# Altium footprint library UAARG Autopilot.PcbLib: 95 footprints (part 6 of 6)
Each footprint in its own frame and in the unit in brackets; x right, y up, seen from the top. Pads: shape width x height; smd on the part's side, far side on the other; paste and mask are expansions set on the pad; w line width, h text height; cw(c..) or ccw(c..) is an arc to the next point about the centre after c.
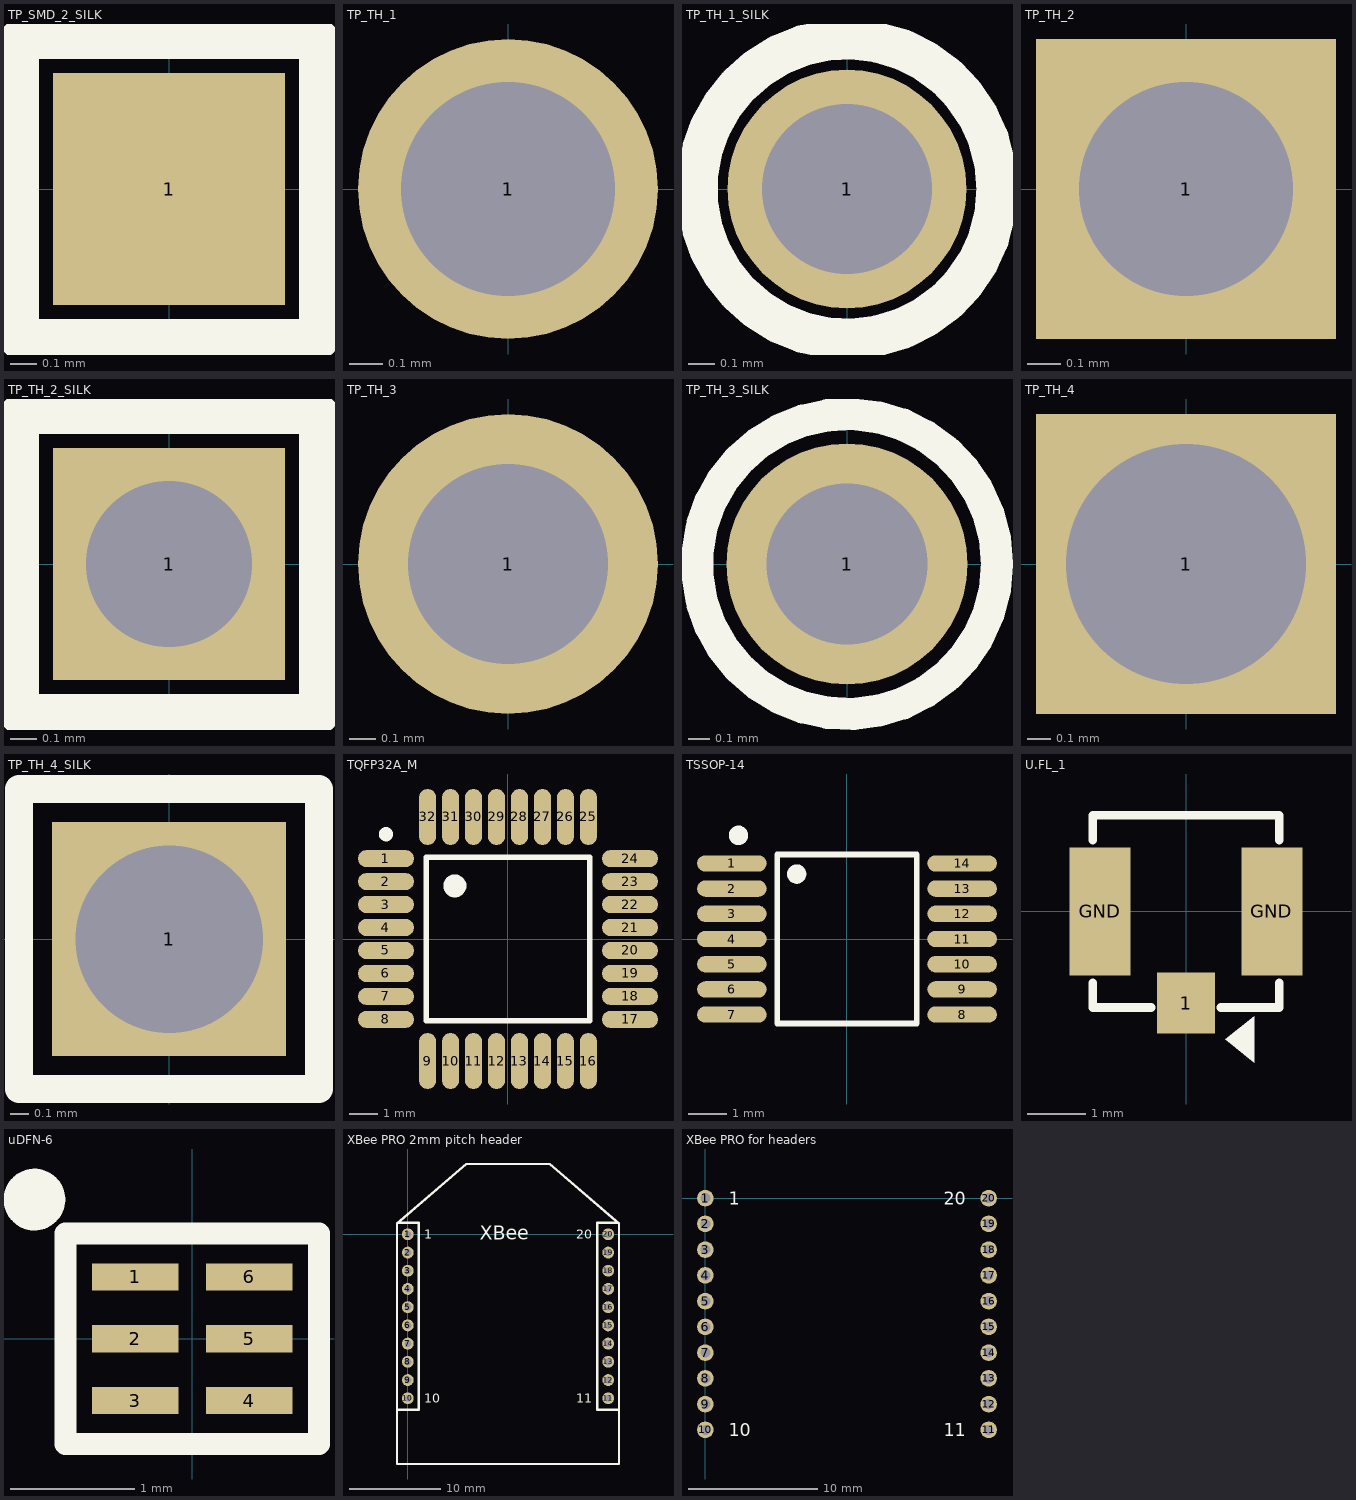
[diagram p5: the footprints below, top view; thin cyan lines are the x and y axes]

## TP_SMD_2_SILK [mil] "Test Point Surface Mount 2"
pads (1):
  rect 35x35 smd paste-17.5: 1(0,0)
Top Overlay:
  lines w6: -22.64,-22.64 22.64,-22.64 22.64,22.64 -22.64,22.64 -22.64,-22.64

## TP_TH_1 [mil] "Test Point Through-hole 1"
pads (1):
  round 35 hole 25: 1(0,0)

## TP_TH_1_SILK [mil] "Test Point Through-hole 1"
pads (1):
  round 35 hole 25: 1(0,0)
Top Overlay:
  circle w6: c0,0 r22

## TP_TH_2 [mil] "Test Point Through-hole 2"
pads (1):
  rect 35x35 hole 25: 1(0,0)

## TP_TH_2_SILK [mil] "Test Point Through-hole 2"
pads (1):
  rect 35x35 hole 25: 1(0,0)
Top Overlay:
  lines w6: -22.64,-22.64 -22.64,22.64 22.64,22.64 22.64,-22.64 -22.64,-22.64

## TP_TH_3 [mil] "Test Point Through-hole 3"
pads (1):
  round 45 hole 30: 1(0,0)

## TP_TH_3_SILK [mil] "Test Point Through-hole 3"
pads (1):
  round 45 hole 30: 1(0,0)
Top Overlay:
  circle w6: c0,0 r28

## TP_TH_4 [mil] "Test Point Through-hole 4"
pads (1):
  rect 50x50 hole 40: 1(0,0)

## TP_TH_4_SILK [mil] "Test Point Through-hole 4"
pads (1):
  rect 50x50 hole 40: 1(0,0)
Top Overlay:
  lines w6: -32,-32 -32,32 32,32 32,-32 -32,-32

## TQFP32A_M [mm] "Thin TQFP, 32-Leads, Body 7x7mm, Pitch 0.8mm, IPC Low Density"
height 1.2
pads (32):
  oval 1.95x0.6 smd: 1(-4.25,2.8) 2(-4.25,2) 3(-4.25,1.2) 4(-4.25,0.4) 5(-4.25,-0.4) 6(-4.25,-1.2) 7(-4.25,-2) 8(-4.25,-2.8) 17(4.25,-2.8) 18(4.25,-2) 19(4.25,-1.2) 20(4.25,-0.4) 21(4.25,0.4) 22(4.25,1.2) 23(4.25,2) 24(4.25,2.8)
  oval 0.6x1.95 smd: 9(-2.8,-4.25) 10(-2,-4.25) 11(-1.2,-4.25) 12(-0.4,-4.25) 13(0.4,-4.25) 14(1.2,-4.25) 15(2,-4.25) 16(2.8,-4.25) 25(2.8,4.25) 26(2,4.25) 27(1.2,4.25) 28(0.4,4.25) 29(-0.4,4.25) 30(-1.2,4.25) 31(-2,4.25) 32(-2.8,4.25)
Top Overlay:
  circle w0.25: c-4.25,3.65 r0.125
  circle w0.4: c-1.85,1.85 r0.2
  lines w0.2: -2.85,-2.85 -2.85,2.85 2.85,2.85 2.85,-2.85 -2.85,-2.85
3D body: height 1.46, standoff 0, extent -4.5,-4.5 4.5,4.5

## TSSOP-14 [mm] "Thin-Shrink Small Outline Package (TSSOP), 16-Leads, Body 4.4x5.0mm, Pitch 0.65mm, IPC Medium Density"
height 1.1
pads (14):
  oval 1.8x0.42 smd: 1(-2.97,1.95) 2(-2.97,1.3) 3(-2.97,0.65) 4(-2.97,0) 5(-2.97,-0.65) 6(-2.97,-1.3) 7(-2.97,-1.95) 8(2.97,-1.95) 9(2.97,-1.3) 10(2.97,-0.65) 11(2.97,0) 12(2.97,0.65) 13(2.97,1.3) 14(2.97,1.95)
Top Overlay:
  circle w0.25: c-1.3,1.675 r0.125
  circle w0.25: c-2.8,2.675 r0.125
  lines w0.152: -1.8,-2.175 -1.8,2.175 1.8,2.175 1.8,-2.175 -1.8,-2.175
3D body: height 1.1, standoff 0, extent -3.2,-2.5 3.2,2.5

## U.FL_1 [mm] "U.FL connector 3x3mm SMT"
height 1.15
pads (3):
  rect 1x1.05 smd: 1(0,-1.575)
  rect 1.05x2.2 smd: GND(-1.475,0) GND(1.475,0)
Top Overlay:
  region: 0.675,-2.2 1.175,-1.8 1.175,-2.6
  lines w0.152: -1.6,-1.225 -1.6,-1.65 -0.6,-1.65 ; -1.6,1.225 -1.6,1.65 1.6,1.65 1.6,1.225 ; 0.6,-1.65 1.6,-1.65 1.6,-1.225
3D body: height 1.26, standoff 0, extent -1.5,-1.55 1.5,1.55

## uDFN-6 [mm] "uDFN 6-Leads, Body 1.5x1.0mm, Pitch 0.5mm"
height 0.75
pads (6):
  rect 0.7x0.22 smd: 1(-0.46,0.5) 2(-0.46,0) 3(-0.46,-0.5) 4(0.46,-0.5) 5(0.46,0) 6(0.46,0.5)
Top Overlay:
  circle w0.25: c-1.275,1.125 r0.125
  lines w0.178: -1.025,-0.85 1.025,-0.85 1.025,0.85 -1.025,0.85 -1.025,-0.85
3D body: height 0.75, standoff 0, extent -0.5,-0.75 0.5,0.75

## XBee PRO 2mm pitch header [mm] "XBee PRO headers"
pads (20):
  round 1.3 hole 0.762: 1(0,0) 2(0,-2) 3(0,-4) 4(0,-6) 5(0,-8) 6(0,-10) 7(0,-12) 8(0,-14) 9(0,-16) 10(0,-18) 11(22,-18) 12(22,-16) 13(22,-14) 14(22,-12) 15(22,-10) 16(22,-8) 17(22,-6) 18(22,-4) 19(22,-2) 20(22,0)
Top Overlay:
  lines w0.254: -1.19,-19.254 1.19,-19.254 1.19,1.19 ; -1.19,1.19 6.4,7.72 15.6,7.72 23.19,1.19 23.19,-25.22 -1.19,-25.22 -1.19,1.177 -1.114,1.254 1.19,1.254 ; 20.81,1.19 20.81,-19.254 23.19,-19.254 ; 20.81,1.254 23.114,1.254
  text "1" at 1.8,-0.5 h1
  text "10" at 1.8,-18.5 h1
  text "11" at 18.5,-18.5 h1
  text "20" at 18.5,-0.5 h1
  text "XBee" at 7.875,-0.6 h1.52
3D body: height 4, standoff -2.8, extent -1.227,-19.254 1.273,1.246
3D body: height 4, standoff -2.8, extent 20.773,-19.254 23.273,1.246

## XBee PRO for headers [mm] "XBee PRO Module with standoff height for headers use"
pads (20):
  round 1.3 hole 0.762: 1(0,0) 2(0,-2) 3(0,-4) 4(0,-6) 5(0,-8) 6(0,-10) 7(0,-12) 8(0,-14) 9(0,-16) 10(0,-18) 11(22,-18) 12(22,-16) 13(22,-14) 14(22,-12) 15(22,-10) 16(22,-8) 17(22,-6) 18(22,-4) 19(22,-2) 20(22,0)
Top Overlay:
  text "1" at 1.8,-0.5 h1
  text "20" at 18.5,-0.5 h1
  text "10" at 1.8,-18.5 h1
  text "11" at 18.5,-18.5 h1
3D body: height 11.78, standoff 0.72, extent -1.27,-25.62 23.114,20.608